# Altium footprint library heromap.PcbLib: 593 footprints (part 10 of 38)
Each footprint in its own frame and in the unit in brackets; x right, y up, seen from the top. Pads: shape width x height; smd on the part's side, far side on the other; paste and mask are expansions set on the pad; w line width, h text height; cw(c..) or ccw(c..) is an arc to the next point about the centre after c.
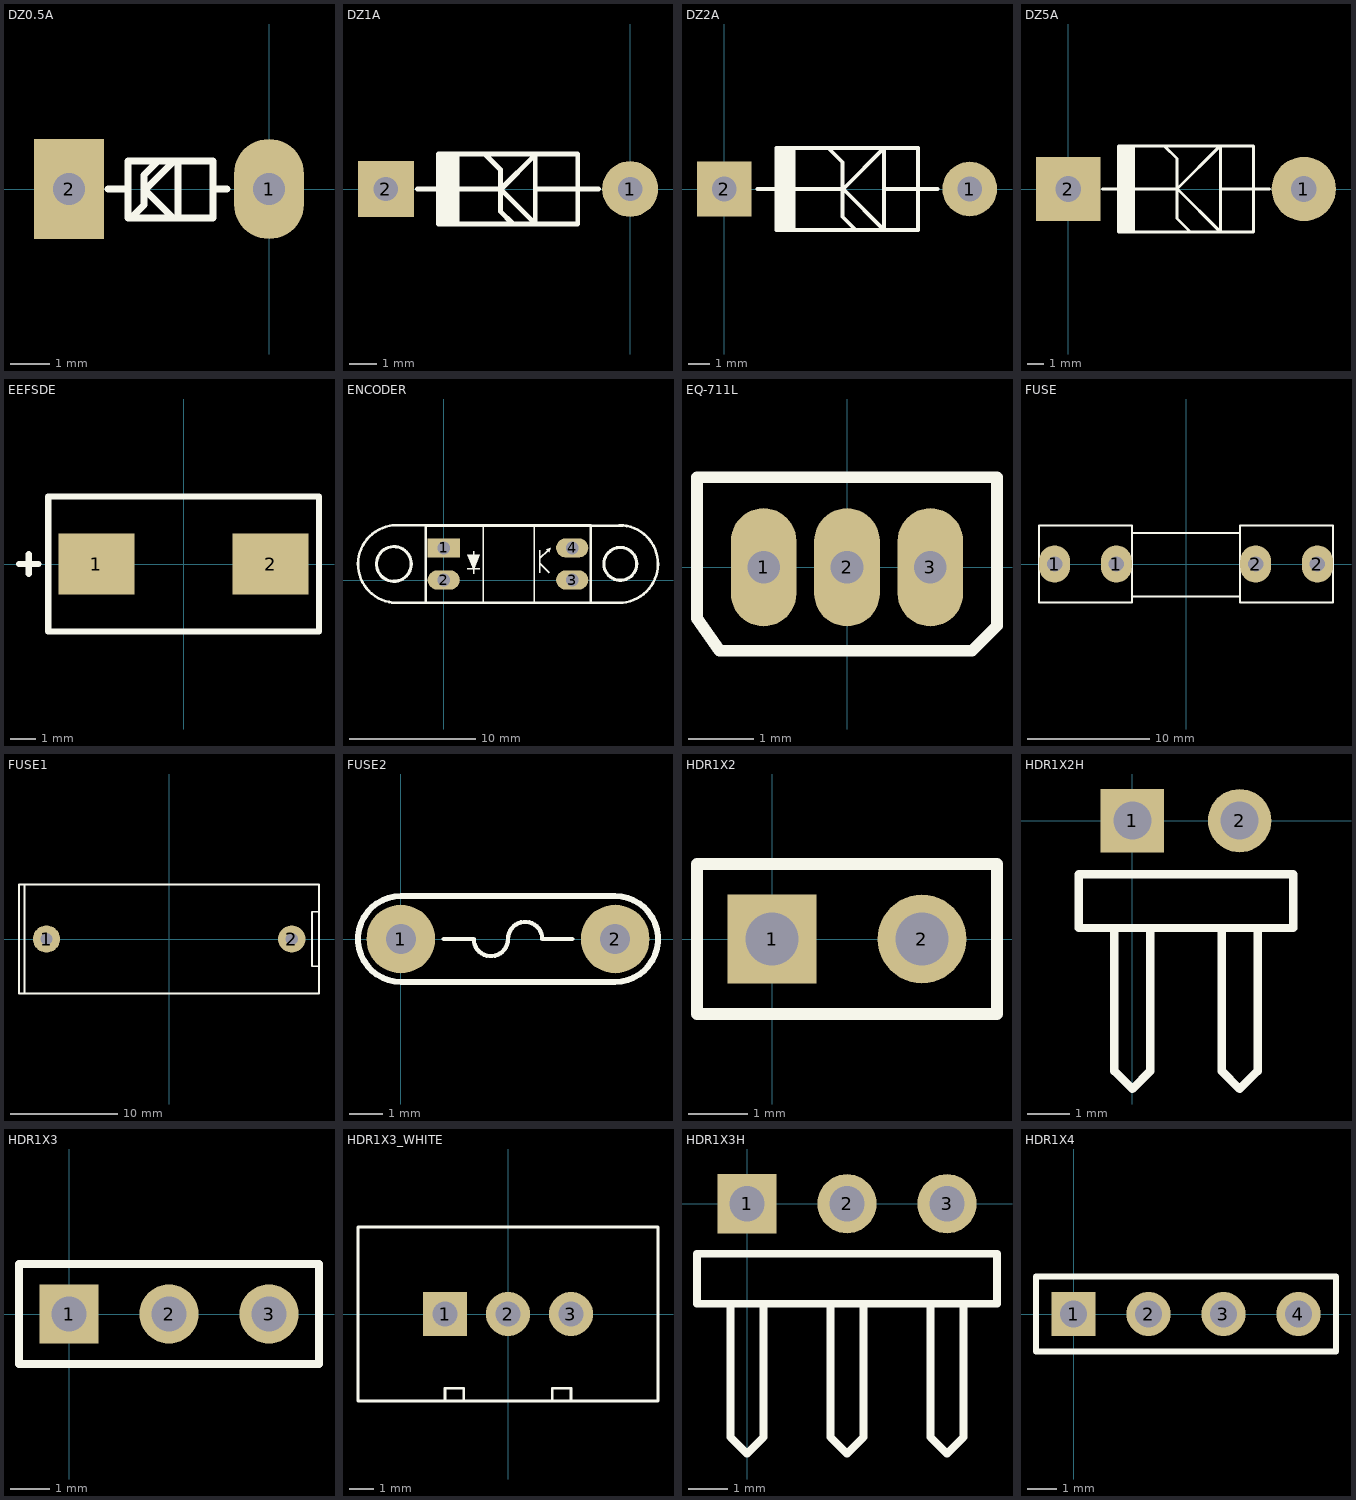
[diagram p9: the footprints below, top view; thin cyan lines are the x and y axes]

## DZ0.5A [mil] "Diode Zenner, W 80mil, L 300mil"
height 80
pads (2):
  oval 70x100 hole 32: 1(0,0)
  rect 70x100 hole 32: 2(-200,0)
Top Overlay:
  lines w7: -161,0 -141,0 ; -138,-29 -125,-16 -125,14 -111.5,27.5 ; -125,-2 -125,0 ; -95,28 -123,0 -125,0 ; -91,28 -91,-27 -89,-29 -93,-29 -96,-29 -125,0 ; -56,0 -42,0 ; -141,-29 -141,28 -56,28 -56,-29 -141,-29

## DZ1A [mil] "Diode 1A, W 100mil, L 350mil"
height 100
pads (2):
  round 80 hole 35: 1(0,0)
  rect 80x80 hole 35: 2(-350,0)
Top Overlay:
  region: -275,50 -275,-50 -245,-50 -245,50
  lines w7: -305,0 -275,0 ; -275,-16 -275,0 ; -275,21 -275,0 ; -255,0 -190,0 ; -208,50 -186,28 -186,-32 -168.5,-49.5 ; -185.5,-0.5 -136,-50 -136,50 -136,49 -185,0 -185,-1 ; -135,0 -75,0 -45,0 ; -275,0 -275,-50 -75,-50 -75,50 -275,50 -275,0
3D body "SW3dPS-Zener 1W.STEP": height 120.61, standoff -50, extent -346,-65 -15,40

## DZ2A [mil] "Diode 2A, W 150mil, L 450mil"
height 100
pads (2):
  round 100 hole 45: 1(450,0)
  rect 100x100 hole 45: 2(0,0)
Top Overlay:
  region: 95,75 95,-75 130,-75 130,75
  lines w7: 61,0 96,0 ; 96,-31 96,0 ; 96,32 96,0 ; 115,0 215,0 ; 194,72 217,49 217,-51 239,-73 ; 218,1 218,0 ; 295,0 360,0 ; 355,0 391,0 ; 218,0 293,-75 293,75 218,0 ; 96,-75 355,-75 355,75 96,75 96,-75
3D body "SW3DPS-DIODE0_4-DEFAULT.STEP": height 100.5, standoff -100, extent -5,-46 425,55

## DZ5A [mil] "Diode 5A, W 200mil, L 550mil"
height 150
pads (2):
  round 150 hole 60: 1(550,0)
  rect 150x150 hole 60: 2(0,0)
Top Overlay:
  region: 115,100 115,-100 155,-100 155,100
  lines w7: 80,0 118,0 ; 118,-44 118,0 ; 118,46 118,0 ; 150,0 255,0 355,-100 355,100 354,100 254,0 ; 225,100 254,71 ; 254,-5 254,6 ; 254,70 254,-69 283,-98 ; 355,0 435,0 ; 432,0 470,0 ; 118,-100 118,100 432,100 432,-100 118,-100

## EEFSDE [mm]
pads (2):
  rect 3x2.4 smd: 1(-3.429,0) 2(3.429,0)
Top Overlay:
  lines w0.254: -6.477,0 -5.715,0 ; -6.096,-0.381 -6.096,0.381 ; -5.334,-2.658 -5.334,2.658 5.334,2.658 5.334,-2.658 -5.334,-2.658
3D body: height 4.2, standoff 0.1, extent -3.65,-2.15 3.65,2.15
3D body: height 0.1, standoff 0, extent -1.778,-2.15 1.778,2.15
3D body: height 0.1, standoff 0, extent -3.81,-1.27 -1.778,1.27
3D body: height 2.1, standoff 0, extent -3.81,-1.27 -3.556,1.27
3D body: height 2.1, standoff 0, extent 3.556,-1.27 3.81,1.27
3D body: height 0.1, standoff 0, extent 1.778,-1.27 3.81,1.27
3D body: height 4.21, standoff 4.2, extent -3.429,-2.15 -2.794,2.15

## ENCODER [mil]
pads (4):
  rect 100x60 hole 40: 1(0,100)
  oval 100x60 hole 40: 2(0,0) 3(400,0) 4(400,100)
Top Overlay:
  circle w10: c-154.96,50 r54.16
  circle w10: c549.9,50.3 r51.2
  region: 112.8,78.45 92.8,30.95 72.8,78.45
  region: 318.92,95.72 328.24,86.74 333.76,100.66
  lines w4: 72.8,34.7 112.8,34.7 ; 92.8,19.7 92.8,89.7 ; 123.5,-70.6 123.5,169.4 ; 281.7,-70.8 281.7,169.2 ; 299,22.9 299,40.4 299,75.4 299,92.9 ; 299,52.9 329,22.9 ; 299.63,67.27 325,92.63
  lines w8: -162.4,-70.2 -51.6,-70.2 ; -160.1,169.9 -54.8,169.9 ; -146.18,-70.65 cw(c-146.18,49.98) -145,170.6 ; 455.3,169.4 556.9,169.4 ; 457.9,-70.5 554,-70.5 ; 545.32,-70.65 ccw(c546.5,49.97) 546.5,170.6 ; -55.8,-70.3 -55.8,169.7 458,169.7 458,-70.3 -55.8,-70.3

## EQ-711L [mm] "TO-92"
height 5.08
pads (3):
  oval 1x1.8 hole 0.5: 1(-1.27,0) 2(0,0) 3(1.27,0)
Top Overlay:
  lines w0.178: -2.286,-0.78 -2.286,1.37 2.286,1.37 2.286,-0.889 1.905,-1.27 -1.943,-1.27 -2.286,-0.78
3D body: height 8.5, standoff -1.5, extent 0.873,-0.399 1.67,0.399
3D body: height 11.2, standoff 8, extent -2.159,-1.143 2.159,1.27
3D body: height 8.5, standoff -1.5, extent -0.397,-0.399 0.4,0.399
3D body: height 8.5, standoff -1.5, extent -1.667,-0.399 -0.87,0.399

## FUSE [mil] "De Fuse"
pads (4):
  oval 100x120 hole 50: 1(-425,0) 1(-225,0) 2(225,0) 2(425,0)
Top Overlay:
  lines w7: -175,-105 175,-105 ; -175,100 175,100 ; -475,-125 -475,125 -175,125 -175,-125 -475,-125 ; 175,-125 475,-125 475,125 175,125 175,-125
3D body "SW3dPS-Fuse Leg_2009.STEP": height 377.88, standoff -129.94, extent 219,-116.71 459,127
3D body "SW3dPS-Fuse Small 1A.STEP": height 370.39, standoff 169.61, extent -384.8,-98 390.8,102.79
3D body "SW3dPS-Fuse Leg_2009.STEP": height 377.88, standoff -129.94, extent -448,-117 -208,126.71

## FUSE1 [mil] "De Fuse Box"
pads (2):
  round 100 hole 45: 1(-450,0) 2(450,0)
Top Overlay:
  lines w7: -531,-199 -531,200 ; 549,-100 525,-100 524,-99 524,100 550,100 ; -551,-200 550,-200 550,200 -551,200 -551,-200

## FUSE2 [mil] "Fuse"
pads (2):
  round 80 hole 35: 1(0,0) 2(250,0)
Top Overlay:
  lines w5: 50,0 85,0 ccw(c105,0) 125,0 cw(c145,0) 165,0 200,0
  lines w7: 0,-50 cw(c0,0) 0,50 250,50 cw(c250,0) 250,-50 0,-50

## HDR1X2 [mm] "Connector; Header; 2 Position"
pads (2):
  rect 1.5x1.5 hole 0.9: 1(0,0)
  round 1.5 hole 0.9: 2(2.54,0)
Top Overlay:
  lines w0.2: -1.27,-1.27 -1.27,1.27 3.81,1.27 3.81,-1.27 -1.27,-1.27
3D body: height 1.5, standoff 0, extent 1.27,-1.27 3.81,1.27
3D body: height 7, standoff -1, extent 2.134,-0.406 2.93,0.392
3D body: height 7, standoff -1, extent -0.406,-0.406 0.39,0.392
3D body: height 1.5, standoff 0, extent -1.27,-1.27 1.27,1.27

## HDR1X2H [mm] "Connector; Header; 2 Position; Right Angle"
pads (2):
  rect 1.5x1.5 hole 0.9: 1(0,0)
  round 1.5 hole 0.9: 2(2.54,0)
Top Overlay:
  lines w0.2: -0.423,-2.54 -0.423,-5.927 0,-6.35 0.423,-5.927 0.423,-2.54 ; 2.117,-2.54 2.117,-5.927 2.54,-6.35 2.963,-5.927 2.963,-2.54 ; -1.27,-2.54 3.81,-2.54 3.81,-1.27 -1.27,-1.27 -1.27,-2.54
3D body "User Library-0_1inch 2 pin strip right angle.step": height 4.33, standoff -3, extent -1.27,-7 3.81,1.27

## HDR1X3 [mm] "Connector; Header; 3 Position"
pads (3):
  rect 1.5x1.5 hole 0.9: 1(0,0)
  round 1.5 hole 0.9: 2(2.54,0) 3(5.08,0)
Top Overlay:
  lines w0.2: -1.27,-1.27 -1.27,1.27 ; -1.27,-1.27 6.35,-1.27 6.35,1.27 -1.27,1.27 ; -1.27,-1.27 -1.27,1.27
3D body: height 7, standoff -1, extent 4.674,-0.406 5.47,0.392
3D body: height 1.5, standoff 0, extent 3.81,-1.27 6.35,1.27
3D body: height 7, standoff -1, extent 2.134,-0.406 2.93,0.392
3D body: height 1.5, standoff 0, extent 1.27,-1.27 3.81,1.27
3D body: height 7, standoff -1, extent -0.406,-0.406 0.39,0.392
3D body: height 1.5, standoff 0, extent -1.27,-1.27 1.27,1.27

## HDR1X3_WHITE [mil]
pads (3):
  rect 70x70 hole 40: 1(-100,0)
  round 70 hole 40: 2(0,0) 3(100,0)
Top Overlay:
  lines w4: -238.11,6 -238.11,81 ; -100,-136.22 -100,-118.11 -70,-118.11 -70,-136.22 ; -86,138.11 -11,138.11 ; -48,-138.11 27,-138.11 ; 14,-138.11 -238.11,-138.11 ; 70,-136.22 70,-118.11 100,-118.11 100,-136.22 ; 238.11,13 238.11,88 ; -238.11,-138.11 238.11,-138.11 238.11,138.11 -238.11,138.11 -238.11,-138.11
3D body: height 39.37, standoff 0, extent -218.09,-118.11 218.11,118.11
3D body: height 196.85, standoff 35.43, extent -218.09,-118.16 218.11,118.11
3D body: height 196.85, standoff 35.43, extent -70,-120 68.9,-99.95
3D body: height 118.11, standoff 35.43, extent -100,-120 -70,-100
3D body: height 118.11, standoff 35.43, extent 68.9,-118.16 100,-99.95
3D body: height 177.17, standoff -39.37, extent -113.5,-12.5 -85.9,13.2
3D body: height 177.17, standoff -39.37, extent -13.5,-12.5 14.1,13.2
3D body: height 177.17, standoff -39.37, extent 86.5,-12.5 114.1,13.2

## HDR1X3H [mm] "Connector; Header; 3 Position; Right Angle"
pads (3):
  rect 1.5x1.5 hole 0.9: 1(0,0)
  round 1.5 hole 0.9: 2(2.54,0) 3(5.08,0)
Top Overlay:
  lines w0.2: -0.423,-2.54 -0.423,-5.927 0,-6.35 0.423,-5.927 0.423,-2.54 ; 2.117,-2.54 2.117,-5.927 2.54,-6.35 2.963,-5.927 2.963,-2.54 ; 4.657,-2.54 4.657,-5.927 5.08,-6.35 5.503,-5.927 5.503,-2.54 ; -1.27,-2.54 -1.27,-1.27 6.35,-1.27 6.35,-2.54 -1.27,-2.54
3D body "User Library-0_1inch 3pin strip right angle.step": height 4.33, standoff -3, extent -1.27,-7 6.35,1.27

## HDR1X4 [mm] "Connector; Header; 4 Position"
pads (4):
  rect 1.5x1.5 hole 0.9: 1(0,0)
  round 1.5 hole 0.9: 2(2.54,0) 3(5.08,0) 4(7.62,0)
Top Overlay:
  lines w0.2: -1.27,-1.27 -1.27,1.27 8.89,1.27 8.89,-1.27 -1.27,-1.27
3D body: height 7, standoff -1, extent -0.406,-0.406 0.39,0.392
3D body: height 1.5, standoff 0, extent -1.27,-1.27 1.27,1.27
3D body: height 7, standoff -1, extent 2.134,-0.406 2.93,0.392
3D body: height 1.5, standoff 0, extent 1.27,-1.27 3.81,1.27
3D body: height 7, standoff -1, extent 4.674,-0.406 5.47,0.392
3D body: height 1.5, standoff 0, extent 3.81,-1.27 6.35,1.27
3D body: height 7, standoff -1, extent 7.214,-0.406 8.01,0.392
3D body: height 1.5, standoff 0, extent 6.35,-1.27 8.89,1.27